# Altium schematic symbol library Schlib.SchLib: 725 symbols (part 4 of 6) (continued)
## LTC2954CDDB-1#TRMPBF (continued)

## LTC2954ITS8-1#TRPBF
designator U?  (value not drawn)
IC PB ON/OFF CONTROLLER TSOT23-8; Manufacturer: Analog Devices / Linear Technology; Manufacturer Part Number: LTC2954ITS8-1#TRPBF; Supplier: Mouser; Supplier Part Number: 584-C2954ITS8-1TRPBF; RoHS: Yes; Category: Voltage Supervisors; Stock: 2500; Pricing: 1=6.18, 10=5.58, 50=5.33, 100=4.63, 1000=3.51, 10000=3.38 (USD); ComponentLink1URL: https://datasheet.ciiva.com/1967/16598-1967661.pdf?src-supplier=Digikey; ComponentLink1Description: https://datasheet.ciiva.com/1967/16598-1967661.pdf?src-supplier=Digikey
footprint TSOT-23_TS8
pins: 1 Vin, 2 ~{PB}, 3 ONT, 4 GND, 5 ~{INT}, 6 EN, 7 PDT, 8 ~{KILL}

## LTC2955IDDB-1#TRMPBF
designator U?  (value not drawn)
Linear TECHNOLOGYLTC2955IDDB-1#TRMPBFIC, Push Button On/off Controller, DFN-10; Manufacturer: Analog Devices / Linear Technology; Min Supply Voltage: 1.6V; Max Supply Voltage: 36V; Operating Supply Current: 1.2uA; Threshold Voltage: 800mV; Supplier: Mouser; Supplier Part Number: 584-C2955IDDB-1TMPF; Manufacturer Part Number: LTC2955IDDB-1#TRMPBF; RoHS: Yes; Category: Voltage Supervisors; Stock: 1191; Pricing: 1=6.87, 10=6.21, 50=5.93, 100=5.15, 1000=4.47, 10000=4.47 (USD); Case/Package: DFN; Pins: 10; Min Operating Temperature: -40°C; Max Operating Temperature: 85°C; Package Quantity: 500; Packaging: Tape and Reel; Nominal Supply Current: 1.2uA; Reach SVHC Compliant: No; Lead Free: Lead Free; RoHS Compliant: Yes; ComponentLink1URL: https://datasheet.ciiva.com/1176/1563221-1176339.pdf?src-supplier=Newark; ComponentLink1Description: https://datasheet.ciiva.com/1176/1563221-1176339.pdf?src-supplier=Newark; ComponentLink2URL: https://datasheet.ciiva.com/1169/1563221-1169346.pdf?src-supplier=Element14; ComponentLink2Description: https://datasheet.ciiva.com/1169/1563221-1169346.pdf?src-supplier=Element14; ComponentLink3URL: https://datasheet.ciiva.com/22621/1563221-22621578.pdf?src-supplier=Element14; ComponentLink3Description: https://datasheet.ciiva.com/22621/1563221-22621578.pdf?src-supplier=Element14; ComponentLink4URL: https://datasheet.ciiva.com/1967/41161-1967533.pdf?src-supplier=Digikey; ComponentLink4Description: https://datasheet.ciiva.com/1967/41161-1967533.pdf?src-supplier=Digikey; ComponentLink5URL: https://datasheet.ciiva.com/1173/1563221-1173151.pdf?src-supplier=Farnell; ComponentLink5Description: https://datasheet.ciiva.com/1173/1563221-1173151.pdf?src-supplier=Farnell; ComponentLink6URL: https://datasheet.ciiva.com/1967/41161-1967535.pdf?src-supplier=Digikey; ComponentLink6Description: https://datasheet.ciiva.com/1967/41161-1967535.pdf?src-supplier=Digikey; ComponentLink7URL: https://datasheet.ciiva.com/48695/001256199-da-01-en-ic-ctlr-ltc2955iddb-1-trmpbf-dfn-10-ltc-48695846.pdf?src-supplier=Conrad; ComponentLink7Description: https://datasheet.ciiva.com/48695/001256199-da-01-en-ic-ctlr-ltc2955iddb-1-trmpbf-dfn-10-ltc-48695846.pdf?src-supplier=Conrad
pins: 1 ~{INT}, 2 ~{PGD}, 3 EN/~{EN}, 4 VIN, 5 ~{PB}, 6 GND, 7 SEL, 8 TMR, 9 ~{KILL}, 10 ON

## LTC2955ITS8-1#TRMPBF
designator U?  (value not drawn)
Controller 1.5V to 36V Tape and Reel 8-Pin TSOT-23; Manufacturer: Analog Devices / Linear Technology; Manufacturer Part Number: LTC2955ITS8-1#TRMPBF; Nominal Supply Current: 1.2uA; Supplier: Mouser; Supplier Part Number: 584-C2955ITS8-1TMPF; RoHS: Yes; Category: Voltage Supervisors; Stock: 10589; Pricing: 1=6.86, 10=6.2, 50=5.89, 100=5.05, 1000=3.87, 10000=3.87 (USD); Lead Free: 5697LeadFree; RoHS Compliant: 5897YesNo; ComponentLink1URL: https://datasheet.ciiva.com/28416/1563221-28416389.pdf?src-supplier=Element14; ComponentLink1Description: https://datasheet.ciiva.com/28416/1563221-28416389.pdf?src-supplier=Element14; ComponentLink2URL: https://datasheet.ciiva.com/6943/1563221-6943848.pdf?src-supplier=Newark; ComponentLink2Description: https://datasheet.ciiva.com/6943/1563221-6943848.pdf?src-supplier=Newark; ComponentLink3URL: https://datasheet.ciiva.com/1176/1563221-1176341.pdf?src-supplier=Newark; ComponentLink3Description: https://datasheet.ciiva.com/1176/1563221-1176341.pdf?src-supplier=Newark; ComponentLink4URL: https://datasheet.ciiva.com/1169/1563221-1169348.pdf?src-supplier=Element14; ComponentLink4Description: https://datasheet.ciiva.com/1169/1563221-1169348.pdf?src-supplier=Element14; ComponentLink5URL: https://datasheet.ciiva.com/31400/1563221-31400492.pdf?src-supplier=Farnell; ComponentLink5Description: https://datasheet.ciiva.com/31400/1563221-31400492.pdf?src-supplier=Farnell; ComponentLink6URL: https://datasheet.ciiva.com/1173/1563221-1173153.pdf?src-supplier=Farnell; ComponentLink6Description: https://datasheet.ciiva.com/1173/1563221-1173153.pdf?src-supplier=Farnell; ComponentLink7URL: https://datasheet.ciiva.com/1967/41161-1967539.pdf?src-supplier=Digikey; ComponentLink7Description: https://datasheet.ciiva.com/1967/41161-1967539.pdf?src-supplier=Digikey; ComponentLink8URL: https://datasheet.ciiva.com/1967/41161-1967540.pdf?src-supplier=Digikey; ComponentLink8Description: https://datasheet.ciiva.com/1967/41161-1967540.pdf?src-supplier=Digikey; ComponentLink9URL: https://datasheet.ciiva.com/1967/41161-1967541.pdf?src-supplier=Digikey; ComponentLink9Description: https://datasheet.ciiva.com/1967/41161-1967541.pdf?src-supplier=Digikey
footprint TSOT-23_TS8
pins: 1 ON, 2 ~{KILL}, 3 TMR, 4 GND, 5 ~{PB}, 6 Vin, 7 EN, 8 ~{INT}

## LTC2955ITS8-2#TRPBF
designator U?  (value not drawn)
IC PB ON/OFF CTRLR TSOT23-8 / Controller 1.5V to 36V Automotive 8-Pin TSOT-23 T/R; Manufacturer: Analog Devices / Linear Technology; Manufacturer Part Number: LTC2955ITS8-2#TRPBF; Operating Supply Current: 1.2uA; Supplier: Mouser; Supplier Part Number: 584-C2955ITS8-2TRPBF; RoHS: Yes; Category: Integrated Circuits (ICs); Stock: 2291; Pricing: 1=6.87, 10=6.21, 50=5.93, 100=5.15, 1000=3.9, 10000=3.75 (USD); Case/Package: SOT-23-8; Pins: 8; Min Operating Temperature: -40°C; Max Operating Temperature: 85°C; Package Quantity: 2500; Packaging: Tape and Reel; Length: 2.9mm; RoHS Compliant: Yes; ComponentLink1URL: https://datasheet.ciiva.com/1967/41161-1967676.pdf?src-supplier=Digikey; ComponentLink1Description: https://datasheet.ciiva.com/1967/41161-1967676.pdf?src-supplier=Digikey
footprint TSOT-23_TS8
pins: 1 ON, 2 ~{KILL}, 3 TMR, 4 GND, 5 ~{PB}, 6 Vin, 7 ~{EN}, 8 ~{INT}

## LTC6992IS6-2#TRMPBF
designator U?  (value not drawn)
Silicon Oscillator 0.00000381MHz to 1MHz CMOS 6-Pin TSOT-23 Tape and Reel; Manufacturer: Analog Devices / Linear Technology; Manufacturer Part Number: LTC6992IS6-2#TRMPBF; Frequency: 3.81Hz; Operating Supply Current: 365uA; Supplier: Farnell; Supplier Part Number: 4023659; RoHS: Yes; Category: Timers and Oscillators; Stock: 328; Pricing: 1=5.18, 10=3.96, 25=3.66, 100=3.18, 250=2.86, 500=2.68 (EUR); Mounting Technology: Surface Mount; Case/Package: SOT-23-6; Pins: 23; Min Operating Temperature: -40°C; Max Operating Temperature: 85°C; Package Quantity: 1; Packaging: Tape and Reel; Series: TimerBlox®; Length: 2.9mm; Depth: 1.75mm; Radiation Hardening: No; RoHS Compliant: Yes; ComponentLink1URL: https://datasheet.ciiva.com/15116/getdatasheetpartid-386929-15116191.pdf?src-supplier=Verical; ComponentLink1Description: https://datasheet.ciiva.com/15116/getdatasheetpartid-386929-15116191.pdf?src-supplier=Verical; ComponentLink2URL: https://datasheet.ciiva.com/6668/29337-6668302.pdf?src-supplier=Digikey; ComponentLink2Description: https://datasheet.ciiva.com/6668/29337-6668302.pdf?src-supplier=Digikey; ComponentLink3URL: https://datasheet.ciiva.com/48709/001253676-da-01-en-ic-osc-ltc6992is6-2-trmpbf-tsot-23-6-ltc-48709111.pdf?src-supplier=Conrad; ComponentLink3Description: https://datasheet.ciiva.com/48709/001253676-da-01-en-ic-osc-ltc6992is6-2-trmpbf-tsot-23-6-ltc-48709111.pdf?src-supplier=Conrad
footprint TSOT-23-6
pins: 1 MOD, 2 GND, 3 SET, 4 DIV, 5 V+, 6 OUT

## LTST-C190KRKT
designator D?  (value not drawn)
Single-color LEDs; LITEON; LTST-C190KRKT; Red; 130 °; 2.4 V; 0603; Manufacturer: Lite-On; Dominant Wavelength: 631nm; Forward Current: 25mA; Forward Voltage: 2.4V; Lens Color: Clear, Colorless; Lens Style: Clear; Luminous Intensity: 18mcd; Number of Circuits: 1; Peak Wavelength: 639nm; Power Dissipation: 62.5mW; Power Rating: 75mW; Reverse Voltage: 5V; Shape: Rectangular; Test Current: 20mA; Tolerance: 20%; Viewing Angle: 260°; Voltage Rating: 50V; Supplier: RS; Supplier Part Number: 1769795; Manufacturer Part Number: LTST-C190KRKT; RoHS: Compliant; Category: LEDs; Stock: 48000; Pricing: 4000=0.029 (GBP); Case/Package: 0603; Case Code (Imperial): 0603; Case Code (Metric): 1608; China RoHS: Compliant; Color: Red; Depth: 800µm; Diameter: 8mm; Height: 800µm; Illumination Color: Red; Lead Free: Lead Free; Lead Pitch: 3.5mm; Length: 11.5mm; Lens Transparency: Clear; Lifecycle Status: Production; Max Operating Temperature: 85°C; Min Operating Temperature: -30°C; Mounting Technology: Surface Mount; Number of Elements: 1; Number of LEDs: 1; Pins: 2; Number of Terminals: 2; Packaging: Bulk; Radiation Hardening: No; REACH SVHC: Yes; Schedule B: 8541402000, 8541402000|8541402000, 8541402000|8541402000|8541402000, 8541402000|8541402000|8541402000|8541402000; Voltage Rating (DC): 50V; Wavelength: 631nm; Width: 800µm; ComponentLink1URL: https://datasheet.octopart.com:443/LTST-C190KRKT-Lite-On-datasheet-32047000.pdf?src-supplier=Upverter; ComponentLink1Description: https://datasheet.octopart.com:443/LTST-C190KRKT-Lite-On-datasheet-32047000.pdf?src-supplier=Upverter; ComponentLink2URL: https://datasheet.octopart.com:443/LTST-C190KRKT-Lite-On-datasheet-114749306.pdf?src-supplier=ODG+(Origin+Data+Global); ComponentLink2Description: https://datasheet.octopart.com:443/LTST-C190KRKT-Lite-On-datasheet-114749306.pdf?src-supplier=ODG+(Origin+Data+Global); ComponentLink3URL: https://datasheet.octopart.com:443/LTST-C190KRKT-Lite-On-datasheet-166650849.pdf?src-supplier=IHS; ComponentLink3Description: https://datasheet.octopart.com:443/LTST-C190KRKT-Lite-On-datasheet-166650849.pdf?src-supplier=IHS; ComponentLink4URL: https://datasheet.octopart.com:443/LTST-C190KRKT-Lite-On-datasheet-158191.pdf?src-supplier=_legacy+Avnet; ComponentLink4Description: https://datasheet.octopart.com:443/LTST-C190KRKT-Lite-On-datasheet-158191.pdf?src-supplier=_legacy+Avnet; ComponentLink5URL: https://datasheet.octopart.com:443/LTST-C190KRKT-Lite-On-datasheet-165573809.pdf?src-supplier=TME; ComponentLink5Description: https://datasheet.octopart.com:443/LTST-C190KRKT-Lite-On-datasheet-165573809.pdf?src-supplier=TME; ComponentLink6URL: https://datasheet.octopart.com:443/LTST-C190KRKT-Lite-On-datasheet-165573808.pdf?src-supplier=TME; ComponentLink6Description: https://datasheet.octopart.com:443/LTST-C190KRKT-Lite-On-datasheet-165573808.pdf?src-supplier=TME; ComponentLink7URL: https://datasheet.octopart.com:443/LTST-C190KRKT-Lite-On-datasheet-12557188.pdf?src-supplier=Future+Electronics; ComponentLink7Description: https://datasheet.octopart.com:443/LTST-C190KRKT-Lite-On-datasheet-12557188.pdf?src-supplier=Future+Electronics; ComponentLink8URL: https://datasheet.octopart.com:443/LTST-C190KRKT-Lite-On-datasheet-8329900.pdf?src-supplier=Future+Electronics; ComponentLink8Description: https://datasheet.octopart.com:443/LTST-C190KRKT-Lite-On-datasheet-8329900.pdf?src-supplier=Future+Electronics; ComponentLink9URL: https://datasheet.octopart.com:443/LTST-C190KRKT-Lite-On-datasheet-8319956.pdf?src-supplier=Jameco; ComponentLink9Description: https://datasheet.octopart.com:443/LTST-C190KRKT-Lite-On-datasheet-8319956.pdf?src-supplier=Jameco; ComponentLink10URL: https://datasheet.octopart.com:443/LTST-C190KRKT-Lite-On-datasheet-94958.pdf?src-supplier=DigiKey; ComponentLink10Description: https://datasheet.octopart.com:443/LTST-C190KRKT-Lite-On-datasheet-94958.pdf?src-supplier=DigiKey
footprint LTST-C190KRKT
pins: 1 C, 2 A

## LTST-C190KSKT
designator D?  (value not drawn)
Single-color LEDs; LITEON; LTST-C190KSKT; Yellow; 130 °; 2.4 V; 0603; Manufacturer: Lite-On; Dominant Wavelength: 597nm; Forward Current: 30mA; Forward Voltage: 2.4V; Lens Color: Clear, Colorless; Lens Style: Clear; Luminous Intensity: 28mcd; Number of Circuits: 1; Peak Wavelength: 588nm; Power Dissipation: 75mW; Power Rating: 100mW; Value: 12kΩ; Reverse Voltage: 5V; Shape: Rectangular; Test Current: 20mA; Tolerance: 1%; Viewing Angle: 130°; Voltage Rating: 50V; Supplier: RS; Supplier Part Number: 6920985; Manufacturer Part Number: LTST-C190KSKT; RoHS: Compliant; Category: LEDs; Stock: 3200; Pricing: 50=0.043, 250=0.027, 500=0.027, 1250=0.026, 2500=0.025 (GBP); Case/Package: 0603; Case Code (Imperial): 0603; Case Code (Metric): 1608; China RoHS: Compliant; Color: Yellow; Contact Plating: Gold; Depth: 1.6mm; Height: 800µm; Illumination Color: Yellow; Lead Free: Lead Free; Length: 1.6mm; Lens Transparency: Clear; Lifecycle Status: Production; Max Operating Temperature: 85°C; Min Operating Temperature: -30°C; Mounting Technology: Surface Mount; Number of Elements: 1; Number of LEDs: 1; Pins: 2; Number of Terminals: 2; Packaging: Tape and Reel; Radiation Hardening: No; REACH SVHC: Yes; Schedule B: 8541402000, 8541402000|8541402000, 8541402000|8541402000|8541402000, 8541402000|8541402000|8541402000|8541402000; Terminal Pitch: 1.5mm; Voltage Rating (DC): 50V; Wavelength: 597nm; Width: 800µm; ComponentLink1URL: https://datasheet.octopart.com:443/LTST-C190KSKT-Lite-On-datasheet-32047001.pdf?src-supplier=Upverter; ComponentLink1Description: https://datasheet.octopart.com:443/LTST-C190KSKT-Lite-On-datasheet-32047001.pdf?src-supplier=Upverter; ComponentLink2URL: https://datasheet.octopart.com:443/LTST-C190KSKT-Lite-On-datasheet-141446390.pdf?src-supplier=ODG+(Origin+Data+Global); ComponentLink2Description: https://datasheet.octopart.com:443/LTST-C190KSKT-Lite-On-datasheet-141446390.pdf?src-supplier=ODG+(Origin+Data+Global); ComponentLink3URL: https://datasheet.octopart.com:443/LTST-C190KSKT-Lite-On-datasheet-180605180.pdf?src-supplier=IHS; ComponentLink3Description: https://datasheet.octopart.com:443/LTST-C190KSKT-Lite-On-datasheet-180605180.pdf?src-supplier=IHS; ComponentLink4URL: https://datasheet.octopart.com:443/LTST-C190KSKT-Lite-On-datasheet-159376.pdf?src-supplier=Future+Electronics; ComponentLink4Description: https://datasheet.octopart.com:443/LTST-C190KSKT-Lite-On-datasheet-159376.pdf?src-supplier=Future+Electronics; ComponentLink5URL: https://datasheet.octopart.com:443/LTST-C190KSKT-Lite-On-datasheet-165573809.pdf?src-supplier=TME; ComponentLink5Description: https://datasheet.octopart.com:443/LTST-C190KSKT-Lite-On-datasheet-165573809.pdf?src-supplier=TME; ComponentLink6URL: https://datasheet.octopart.com:443/LTST-C190KSKT-Lite-On-datasheet-165573808.pdf?src-supplier=TME; ComponentLink6Description: https://datasheet.octopart.com:443/LTST-C190KSKT-Lite-On-datasheet-165573808.pdf?src-supplier=TME; ComponentLink7URL: https://datasheet.octopart.com:443/LTST-C190KSKT-Lite-On-datasheet-13699376.pdf?src-supplier=_legacy+Avnet; ComponentLink7Description: https://datasheet.octopart.com:443/LTST-C190KSKT-Lite-On-datasheet-13699376.pdf?src-supplier=_legacy+Avnet; ComponentLink8URL: https://datasheet.octopart.com:443/LTST-C190KSKT-Lite-On-datasheet-11642499.pdf?src-supplier=Arrow+Electronics; ComponentLink8Description: https://datasheet.octopart.com:443/LTST-C190KSKT-Lite-On-datasheet-11642499.pdf?src-supplier=Arrow+Electronics; ComponentLink9URL: https://datasheet.octopart.com:443/LTST-C190KSKT-Lite-On-datasheet-73796.pdf?src-supplier=DigiKey; ComponentLink9Description: https://datasheet.octopart.com:443/LTST-C190KSKT-Lite-On-datasheet-73796.pdf?src-supplier=DigiKey
footprint LTST-C190KSKT
pins: 1 K2, 2 A2

## LTST-C191KFKT
designator D?  (value not drawn)
Orange 0603 130° Water Clear 90 mcd 2 V SMT Rectangular Flat Top LED; Manufacturer: Lite-On; Manufacturer Part Number: LTST-C191KFKT; Dominant Wavelength: 605nm; Forward Current: 30mA; Forward Voltage: 2.4V; Lens Color: Colorless; Luminous Intensity: 90mcd; Number of Circuits: 1; Peak Wavelength: 611nm; Power Dissipation: 75mW; Reverse Voltage: 5V; Test Current: 20mA; Supplier: Avnet; Supplier Part Number: LTST-C191KFKT; RoHS: Compliant; Category: LEDs; Stock: 10000; Pricing: 5000=0.025, 10000=0.02444, 20000=0.02388, 40000=0.02331, 80000=0.02275 (USD); Case/Package: 0603; Case Code (Imperial): 0603; Case Code (Metric): 1608; China RoHS: Compliant; Color: Orange; Depth: 800µm; Height: 550µm; Illumination Color: Orange; Lead Free: Lead Free; Length: 1.6mm; Lens Transparency: Clear; Lifecycle Status: Production; Max Operating Temperature: 85°C; Min Operating Temperature: -55°C; Mounting Technology: Surface Mount; Number of Elements: 1; Number of LEDs: 1; Pins: 2; Number of Terminals: 2; Packaging: Cut Tape; Power Rating: 75mW; Radiation Hardening: No; REACH SVHC: Yes; Schedule B: 8541402000, 8541402000|8541402000|8541402000|8541402000|8541402000; Shape: Rectangular; Terminal Pitch: 1.5mm; Viewing Angle: 130°; Wavelength: 605nm; Width: 800µm; ComponentLink1URL: https://datasheet.octopart.com:443/LTST-C191KFKT-Lite-On-datasheet-141422090.pdf?src-supplier=ODG+(Origin+Data+Global); ComponentLink1Description: https://datasheet.octopart.com:443/LTST-C191KFKT-Lite-On-datasheet-141422090.pdf?src-supplier=ODG+(Origin+Data+Global); ComponentLink2URL: https://datasheet.octopart.com:443/LTST-C191KFKT-Lite-On-datasheet-180605189.pdf?src-supplier=IHS; ComponentLink2Description: https://datasheet.octopart.com:443/LTST-C191KFKT-Lite-On-datasheet-180605189.pdf?src-supplier=IHS; ComponentLink3URL: https://datasheet.octopart.com:443/LTST-C191KFKT-Lite-On-datasheet-41172769.pdf?src-supplier=TME; ComponentLink3Description: https://datasheet.octopart.com:443/LTST-C191KFKT-Lite-On-datasheet-41172769.pdf?src-supplier=TME; ComponentLink4URL: https://datasheet.octopart.com:443/LTST-C191KFKT-Lite-On-datasheet-165573808.pdf?src-supplier=TME; ComponentLink4Description: https://datasheet.octopart.com:443/LTST-C191KFKT-Lite-On-datasheet-165573808.pdf?src-supplier=TME; ComponentLink5URL: https://datasheet.octopart.com:443/LTST-C191KFKT-Lite-On-datasheet-13695973.pdf?src-supplier=_legacy+Avnet; ComponentLink5Description: https://datasheet.octopart.com:443/LTST-C191KFKT-Lite-On-datasheet-13695973.pdf?src-supplier=_legacy+Avnet; ComponentLink6URL: https://datasheet.octopart.com:443/LTST-C191KFKT-Lite-On-datasheet-158560.pdf?src-supplier=Mouser; ComponentLink6Description: https://datasheet.octopart.com:443/LTST-C191KFKT-Lite-On-datasheet-158560.pdf?src-supplier=Mouser; ComponentLink7URL: https://datasheet.octopart.com:443/LTST-C191KFKT-Lite-On-datasheet-134312.pdf?src-supplier=DigiKey; ComponentLink7Description: https://datasheet.octopart.com:443/LTST-C191KFKT-Lite-On-datasheet-134312.pdf?src-supplier=DigiKey
footprint LTST-C191KFKT
pins: 1 C, 2 A

## LTST-C191KGKT
designator D?  (value not drawn)
LED,  LTST-C191KGKT; Manufacturer: Vishay Lite-On; Color: Green; Lens Color: Colorless; Luminous Intensity: 35mcd; Viewing Angle: 130°; Lens Style: Rectangular,Colorless; Forward Current: 30mA; Forward Voltage: 2V; Dominant Wavelength: 571nm; Test Current: 20mA; Lens Transparency: Clear; Number of Elements: 1; Power Dissipation: 75mW; Wavelength: 574nm; Reverse Voltage: 5V; Supplier: Digi-Key; Supplier Part Number: 160-1446-1-ND; Manufacturer Part Number: LTST-C191KGKT; RoHS: Yes; Category: Uncategorized; Stock: 2799441; Pricing: 1=0.26000, 10=0.14100, 100=0.06560, 500=0.06060, 1000=0.04747, 2000=0.04646 (USD); Mounting Technology: Surface Mount; Case/Package: 0603; Pins: 2; Case Code (Metric): 1608; Case Code (Imperial): 0603; Min Operating Temperature: -55°C; Max Operating Temperature: 85°C; Packaging: Tape and Reel; Package Quantity: 1; Illumination Color: Green; Number of LEDs: 1; Power Rating: 75mW; Max Power Dissipation: 75mW; Length: 1.6mm; Width: 0.8mm; Height: 0.55mm; Depth: 0.8mm; Radiation Hardening: No; RoHS Compliant: Yes; Lead Free: Lead Free; ComponentLink1URL: https://datasheet.ciiva.com/2109/ltst-c191kgkt-2109973.pdf?src-supplier=Digi-Key; ComponentLink1Description: https://datasheet.ciiva.com/2109/ltst-c191kgkt-2109973.pdf?src-supplier=Digi-Key
footprint LTST-C191KGKT
pins: 1 K2, 2 A2

## LTST-C191KSKT
designator D?  (value not drawn)
LED YELLOW CLEAR 0603 SMD; Manufacturer: Vishay Lite-On; Manufacturer Part Number: LTST-C191KSKT; Lens Color: Colorless; Viewing Angle: 130°; Lens Style: Diffused,Colorless,Rectangular,Clear; Luminous Intensity: 180mcd; Forward Current: 30mA; Forward Voltage: 2.4V; Power Rating: 75mW; Dominant Wavelength: 597nm; Test Current: 20mA; Number of Elements: 1; Wavelength: 588nm; Reverse Voltage: 5V; Supplier: Digi-Key; Supplier Part Number: 160-1448-1-ND; RoHS: Yes; Category: LEDs; Stock: 1462399; Pricing: 1=0.28000, 10=0.15000, 100=0.06990, 500=0.06450, 1000=0.05052, 2000=0.04945 (USD); Mounting Technology: Surface Mount; Case/Package: 0603; Pins: 2; Color: Yellow; Case Code (Metric): 1608; Case Code (Imperial): 0603; Min Operating Temperature: -55°C; Max Operating Temperature: 85°C; Package Quantity: 1; Packaging: Tape and Reel; Illumination Color: Yellow; Lens Transparency: Clear; Power Dissipation: 75mW; Number of LEDs: 1; Length: 1.6mm; Width: 0.8mm; Height: 0.55mm; Depth: 0.8mm; Radiation Hardening: No; RoHS Compliant: Yes; Lead Free: Lead Free; ComponentLink1URL: https://datasheet.ciiva.com/12400/lite-on-ltst-c191kskt-190097-12400797.pdf?src-supplier=Mouser; ComponentLink1Description: https://datasheet.ciiva.com/12400/lite-on-ltst-c191kskt-190097-12400797.pdf?src-supplier=Mouser; ComponentLink2URL: https://datasheet.ciiva.com/16213/lite-on20ltst-c191kskt-16213725.pdf?src-supplier=Future+Electronics; ComponentLink2Description: https://datasheet.ciiva.com/16213/lite-on20ltst-c191kskt-16213725.pdf?src-supplier=Future+Electronics; ComponentLink3URL: https://datasheet.ciiva.com/15117/getdatasheetpartid-141495-15117732.pdf?src-supplier=Verical; ComponentLink3Description: https://datasheet.ciiva.com/15117/getdatasheetpartid-141495-15117732.pdf?src-supplier=Verical; ComponentLink4URL: https://datasheet.ciiva.com/11773/0900766b80dc02b3-11773512.pdf?src-supplier=Rs; ComponentLink4Description: https://datasheet.ciiva.com/11773/0900766b80dc02b3-11773512.pdf?src-supplier=Rs; ComponentLink5URL: https://datasheet.ciiva.com/2109/s-110-ltst-c191kskt-2109984.pdf?src-supplier=Digi-Key; ComponentLink5Description: https://datasheet.ciiva.com/2109/s-110-ltst-c191kskt-2109984.pdf?src-supplier=Digi-Key
footprint LTST-C191KSKT
pins: 1 K2, 2 A2

## LTST-S270KFKT
designator D?  (value not drawn)
LED Low-Power Uni-Color Orange 611nm 2V 2-Pin Chip LED T/R; Manufacturer: Vishay Lite-On; Manufacturer Part Number: LTST-S270KFKT; Lens Color: Colorless; Lens Style: Diffused,Colorless,Rectangular,Clear; Viewing Angle: 130°; Luminous Intensity: 90mcd; Forward Current: 20mA; Dominant Wavelength: 605nm; Number of Elements: 1; Power Dissipation: 75mW; Reverse Voltage: 5V; Lens Transparency: Clear; Supplier: Rs; Supplier Part Number: 6921215P; RoHS: Yes; Category: LEDs; Stock: 6300; Pricing: 250=0.04800, 500=0.04500, 1250=0.03600, 2500=0.03400 (GBP); Mounting Technology: Surface Mount; Case/Package: 0603; Pins: 2; Color: Orange; Case Code (Metric): 1608; Case Code (Imperial): 0603; Min Operating Temperature: -55°C; Max Operating Temperature: 85°C; Forward Voltage: 2V; Packaging: Tape and Reel; Test Current: 20mA; Package Quantity: 1; Illumination Color: Orange; Power Rating: 75mW; Wavelength: 611nm; Number of LEDs: 1; Length: 1.6mm; Width: 1.15mm; Height: 0.6mm; Depth: 0.6mm; Radiation Hardening: No; Lead Free: Lead Free; RoHS Compliant: Yes; ComponentLink1URL: https://datasheet.ciiva.com/12400/ltst-s270kfkt-201846-12400779.pdf?src-supplier=Mouser; ComponentLink1Description: https://datasheet.ciiva.com/12400/ltst-s270kfkt-201846-12400779.pdf?src-supplier=Mouser; ComponentLink2URL: https://datasheet.ciiva.com/11775/0900766b80dc0b87-11775446.pdf?src-supplier=Rs; ComponentLink2Description: https://datasheet.ciiva.com/11775/0900766b80dc0b87-11775446.pdf?src-supplier=Rs; ComponentLink3URL: https://datasheet.ciiva.com/2109/s-110-ltst-s270kfkt-2109995.pdf?src-supplier=Digi-Key; ComponentLink3Description: https://datasheet.ciiva.com/2109/s-110-ltst-s270kfkt-2109995.pdf?src-supplier=Digi-Key; ComponentLink4URL: https://datasheet.ciiva.com/2109/s-110-ltst-s270kfkt-2109996.pdf?src-supplier=Digi-Key; ComponentLink4Description: https://datasheet.ciiva.com/2109/s-110-ltst-s270kfkt-2109996.pdf?src-supplier=Digi-Key
footprint LTST-S270KFKT
pins: 1 C, 2 A

## LTST-S270KGKT
designator D?  (value not drawn)
LED GREEN CLEAR 0603 R/A SMD; Manufacturer: Vishay Lite-On; Manufacturer Part Number: LTST-S270KGKT; Lens Color: Colorless; Forward Current: 30mA; Forward Voltage: 2V; Power Rating: 75mW; Luminous Intensity: 71mcd; Viewing Angle: 130°; Lens Style: Diffused,Colorless,Rectangular,Clear; Dominant Wavelength: 571nm; Test Current: 20mA; Number of Elements: 1; Wavelength: 574nm; Reverse Voltage: 5V; Supplier: Rs; Supplier Part Number: 6921219P; RoHS: Yes; Category: LEDs; Stock: 35150; Pricing: 250=0.06300, 500=0.05900, 1250=0.03700, 2500=0.03500 (GBP); Mounting Technology: Surface Mount; Case/Package: 0603; Pins: 2; Color: Green; Case Code (Metric): 1608; Case Code (Imperial): 0603; Min Operating Temperature: -55°C; Max Operating Temperature: 85°C; Illumination Color: Green; Packaging: Tape and Reel; Package Quantity: 1; Lens Transparency: Clear; Power Dissipation: 75mW; Number of LEDs: 1; Length: 1.6mm; Width: 1.15mm; Height: 0.6mm; Depth: 0.6mm; Radiation Hardening: No; Lead Free: Lead Free; RoHS Compliant: Yes; ComponentLink1URL: https://datasheet.ciiva.com/2110/ltst-s270kgkt-2110006.pdf?src-supplier=Digi-Key; ComponentLink1Description: https://datasheet.ciiva.com/2110/ltst-s270kgkt-2110006.pdf?src-supplier=Digi-Key; ComponentLink2URL: https://datasheet.ciiva.com/12400/ltst-s270kgkt-201847-12400865.pdf?src-supplier=Mouser; ComponentLink2Description: https://datasheet.ciiva.com/12400/ltst-s270kgkt-201847-12400865.pdf?src-supplier=Mouser; ComponentLink3URL: https://datasheet.ciiva.com/4266/dwonloadfilehandler-ashxtxtspecnods222000226-4266440.pdf?src-supplier=Arrow+Electronics; ComponentLink3Description: https://datasheet.ciiva.com/4266/dwonloadfilehandler-ashxtxtspecnods222000226-4266440.pdf?src-supplier=Arrow+Electronics; ComponentLink4URL: https://datasheet.ciiva.com/11774/0900766b80dc0b88-11774745.pdf?src-supplier=Rs; ComponentLink4Description: https://datasheet.ciiva.com/11774/0900766b80dc0b88-11774745.pdf?src-supplier=Rs; ComponentLink5URL: https://datasheet.ciiva.com/2110/s-110-ltst-s270kgkt-2110007.pdf?src-supplier=Digi-Key; ComponentLink5Description: https://datasheet.ciiva.com/2110/s-110-ltst-s270kgkt-2110007.pdf?src-supplier=Digi-Key; ComponentLink6URL: https://datasheet.ciiva.com/2110/s-110-ltst-s270kgkt-2110008.pdf?src-supplier=Digi-Key; ComponentLink6Description: https://datasheet.ciiva.com/2110/s-110-ltst-s270kgkt-2110008.pdf?src-supplier=Digi-Key; ComponentLink7URL: https://datasheet.ciiva.com/16448/ltst-s270kgkt-16448566.pdf?src-supplier=Future+Electronics; ComponentLink7Description: https://datasheet.ciiva.com/16448/ltst-s270kgkt-16448566.pdf?src-supplier=Future+Electronics
footprint LTST-S270KGKT
pins: 1 C, 2 A

## LTST-S270KRKT
designator D?  (value not drawn)
LED Low-Power Uni-Color Red 639nm 2V 2-Pin Chip LED T/R; Manufacturer: Vishay Lite-On; Manufacturer Part Number: LTST-S270KRKT; Lens Color: Colorless; Forward Current: 30mA; Luminous Intensity: 54mcd; Viewing Angle: 130°; Lens Style: Diffused,Colorless,Clear,Rectangular; Power Rating: 75mW; Dominant Wavelength: 631nm; Test Current: 20mA; Lens Transparency: Clear; Number of Elements: 1; Reverse Voltage: 5V; Supplier: Rs; Supplier Part Number: 6921228P; RoHS: Yes; Category: LEDs; Stock: 29845; Pricing: 250=0.06300, 500=0.05900, 1250=0.03700, 2500=0.03500 (GBP); Mounting Technology: Surface Mount; Case/Package: 0603; Pins: 2; Color: Red; Case Code (Metric): 1608; Case Code (Imperial): 0603; Min Operating Temperature: -55°C; Max Operating Temperature: 85°C; Packaging: Tape and Reel; Forward Voltage: 2V; Package Quantity: 1; Illumination Color: Red; Power Dissipation: 75mW; Wavelength: 639nm; Number of LEDs: 1; Max Power Dissipation: 75mW; Length: 1.6mm; Width: 1.15mm; Height: 0.6mm; Depth: 0.6mm; Radiation Hardening: No; Lead Free: Lead Free; RoHS Compliant: Yes; ComponentLink1URL: https://datasheet.ciiva.com/2110/ltst-s270krkt-2110021.pdf?src-supplier=Digi-Key; ComponentLink1Description: https://datasheet.ciiva.com/2110/ltst-s270krkt-2110021.pdf?src-supplier=Digi-Key; ComponentLink2URL: https://datasheet.ciiva.com/12400/ltst-s270krkt-201849-12400833.pdf?src-supplier=Mouser; ComponentLink2Description: https://datasheet.ciiva.com/12400/ltst-s270krkt-201849-12400833.pdf?src-supplier=Mouser; ComponentLink3URL: https://datasheet.ciiva.com/16387/p-100-ltst-s270krkt-16387507.pdf?src-supplier=Future+Electronics; ComponentLink3Description: https://datasheet.ciiva.com/16387/p-100-ltst-s270krkt-16387507.pdf?src-supplier=Future+Electronics; ComponentLink4URL: https://datasheet.ciiva.com/11775/0900766b80dc0b8e-11775445.pdf?src-supplier=Rs; ComponentLink4Description: https://datasheet.ciiva.com/11775/0900766b80dc0b8e-11775445.pdf?src-supplier=Rs; ComponentLink5URL: https://datasheet.ciiva.com/2110/s-110-ltst-s270krkt-2110022.pdf?src-supplier=Digi-Key; ComponentLink5Description: https://datasheet.ciiva.com/2110/s-110-ltst-s270krkt-2110022.pdf?src-supplier=Digi-Key; ComponentLink6URL: https://datasheet.ciiva.com/2110/s-110-ltst-s270krkt-2110023.pdf?src-supplier=Digi-Key; ComponentLink6Description: https://datasheet.ciiva.com/2110/s-110-ltst-s270krkt-2110023.pdf?src-supplier=Digi-Key
footprint LTST-S270KRKT
pins: 1 C, 2 A

## LTST-S270KSKT
designator D?  (value not drawn)
OPTOELECTRONICS - SMD Chip LED - SideView Single Color Chip LED, Yellow, 589 at 20mA, 28 to approx. 180 at 20mA; Manufacturer: Vishay Lite-On; Manufacturer Part Number: LTST-S270KSKT; Lens Color: Colorless; Power Rating: 75mW; Luminous Intensity: 80mcd; Viewing Angle: 130°; Lens Style: Diffused,Colorless,Rectangular,Clear; Forward Voltage: 2V; Forward Current: 30mA; Dominant Wavelength: 587nm; Lens Transparency: Clear; Number of Elements: 1; Reverse Voltage: 5V; Supplier: Rs; Supplier Part Number: 6921221P; RoHS: Yes; Category: LEDs; Stock: 4950; Pricing: 100=0.113 (EUR); Mounting Technology: Surface Mount; Case/Package: 0603; Pins: 2; Color: Yellow; Case Code (Metric): 1608; Case Code (Imperial): 0603; Min Operating Temperature: -55°C; Max Operating Temperature: 85°C; Packaging: Tape and Reel; Package Quantity: 1; Illumination Color: Yellow; Test Current: 20mA; Power Dissipation: 75mW; Wavelength: 587nm; Number of LEDs: 1; Length: 1.6mm; Width: 1.15mm; Height: 0.6mm; Depth: 0.6mm; Radiation Hardening: No; Lead Free: Lead Free; RoHS Compliant: Yes; ComponentLink1URL: https://datasheet.ciiva.com/11773/0900766b80dc0b8f-11773831.pdf?src-supplier=Rs; ComponentLink1Description: https://datasheet.ciiva.com/11773/0900766b80dc0b8f-11773831.pdf?src-supplier=Rs; ComponentLink2URL: https://datasheet.ciiva.com/12400/ltst-s270kskt-201858-12400983.pdf?src-supplier=Mouser; ComponentLink2Description: https://datasheet.ciiva.com/12400/ltst-s270kskt-201858-12400983.pdf?src-supplier=Mouser; ComponentLink3URL: https://datasheet.ciiva.com/16390/ltst-s270kskt-16390329.pdf?src-supplier=Future+Electronics; ComponentLink3Description: https://datasheet.ciiva.com/16390/ltst-s270kskt-16390329.pdf?src-supplier=Future+Electronics; ComponentLink4URL: https://datasheet.ciiva.com/2110/s-110-ltst-s270kskt-2110139.pdf?src-supplier=Digikey; ComponentLink4Description: https://datasheet.ciiva.com/2110/s-110-ltst-s270kskt-2110139.pdf?src-supplier=Digikey; ComponentLink5URL: https://datasheet.ciiva.com/2110/s-110-ltst-s270kskt-2110140.pdf?src-supplier=Digikey; ComponentLink5Description: https://datasheet.ciiva.com/2110/s-110-ltst-s270kskt-2110140.pdf?src-supplier=Digikey
footprint LTST-S270KSKT
pins: 1 K2, 2 A2

## LUCID_12S 90A ESC
designator ESC?  (value not drawn)
LUCID_12S 90A ESC; Manufacturer Part Number: LUCID_12S 90A ESC
footprint LUCID_12S 90A ESC
pins: 1 GND, 2 BAT+, 3 U, 4 V, 5 W, 6 S_GND, 7 Tx, 8 Rx, 9 PWM

## LVK12R020DER
designator R?  value 20mR  (hidden comment: *)
Res Metal Alloy 1206 0.02 Ohm 0.5% 0.5W(1/2W) ±50ppm/C Pad SMD T/R; Manufacturer: Ohmite; Manufacturer Part Number: LVK12R020DER; Supplier: Mouser; Supplier Part Number: 588-LVK12R020DER; RoHS: Yes; Category: Chip SMD Resistors; Stock: 22006; Pricing: 1=0.73, 10=0.625, 50=0.518, 100=0.428, 1000=0.264, 10000=0.264 (USD); Reach SVHC Compliant: 4187SVHC; ComponentLink1URL: https://datasheet.ciiva.com/5469/lvk-5469511.pdf?src-supplier=Mouser; ComponentLink1Description: https://datasheet.ciiva.com/5469/lvk-5469511.pdf?src-supplier=Mouser; ComponentLink2URL: https://datasheet.ciiva.com/46385/1786747-46385559.pdf?src-supplier=Element14; ComponentLink2Description: https://datasheet.ciiva.com/46385/1786747-46385559.pdf?src-supplier=Element14; ComponentLink3URL: https://datasheet.ciiva.com/2482/res-lvk-2482377.pdf?src-supplier=Digikey; ComponentLink3Description: https://datasheet.ciiva.com/2482/res-lvk-2482377.pdf?src-supplier=Digikey; ComponentLink4URL: https://datasheet.ciiva.com/2482/res-lvk-2482378.pdf?src-supplier=Digikey; ComponentLink4Description: https://datasheet.ciiva.com/2482/res-lvk-2482378.pdf?src-supplier=Digikey; ComponentLink5URL: https://datasheet.ciiva.com/2482/res-lvk-2482379.pdf?src-supplier=Digikey; ComponentLink5Description: https://datasheet.ciiva.com/2482/res-lvk-2482379.pdf?src-supplier=Digikey; ComponentLink6URL: https://datasheet.ciiva.com/7937/575641-7937853.pdf?src-supplier=Element14; ComponentLink6Description: https://datasheet.ciiva.com/7937/575641-7937853.pdf?src-supplier=Element14; ComponentLink7URL: https://datasheet.ciiva.com/7937/575641-7937854.pdf?src-supplier=Element14; ComponentLink7Description: https://datasheet.ciiva.com/7937/575641-7937854.pdf?src-supplier=Element14; ComponentLink8URL: https://datasheet.ciiva.com/15865/40lvk-15865311.pdf?src-supplier=Onlinecomponents.com; ComponentLink8Description: https://datasheet.ciiva.com/15865/40lvk-15865311.pdf?src-supplier=Onlinecomponents.com; Case/Package: 1206
footprint LVK12R020DER
pins: 1 B, 2 B, 3 B, 4 A

## LXES1UTAA1-157
designator D?  (value not drawn)
ESD Suppressor Diode TVS Bi-Dir 6V 2-Pin DFN T/R; Manufacturer: Murata; Manufacturer Part Number: LXES1UTAA1-157; Supplier: Digi-Key; Supplier Part Number: 490-12804-1-ND; RoHS: Yes; Category: TVS Diodes; Stock: 106472; Pricing: 1=0.42, 10=0.312, 100=0.1768, 500=0.11712, 1000=0.08979, 2000=0.07808, 5000=0.07027 (USD); ComponentLink1URL: http://www.mouser.com/ds/2/281/TPESD-E-1102056.pdf?src-supplier=Mouser; ComponentLink1Description: http://www.mouser.com/ds/2/281/TPESD-E-1102056.pdf?src-supplier=Mouser; ComponentLink2URL: https://www.murata.com/en-us/products/productdata/8796859793438/TPESD-E.pdf?src-supplier=Digi-Key; ComponentLink2Description: https://www.murata.com/en-us/products/productdata/8796859793438/TPESD-E.pdf?src-supplier=Digi-Key; ComponentLink3URL: https://www.murata.com/en-us/products/productdata/8796782067742/L0160E.pdf?src-supplier=Digi-Key; ComponentLink3Description: https://www.murata.com/en-us/products/productdata/8796782067742/L0160E.pdf?src-supplier=Digi-Key; ComponentLink4URL: http://www.murata.com/en-us/products/productdata/8796859793438/TPESD-E.pdf?src-supplier=Digi-Key; ComponentLink4Description: http://www.murata.com/en-us/products/productdata/8796859793438/TPESD-E.pdf?src-supplier=Digi-Key
footprint LXES1UTAA1-157
pins: 1 C, 2 A

## M80-5401222
designator J?  value M80-5401222
HARWIN 6+6 Datamate J-Tek MALE 3mm connector; Part Number: M80-5401222
footprint HARWIN_M80-5401222 (HARWIN 6+6 Datamate J-Tek MALE 3mm connector)
pins: 1, 2, 3, 4, 5, 6, 7, 8, 9, 10, 11, 12

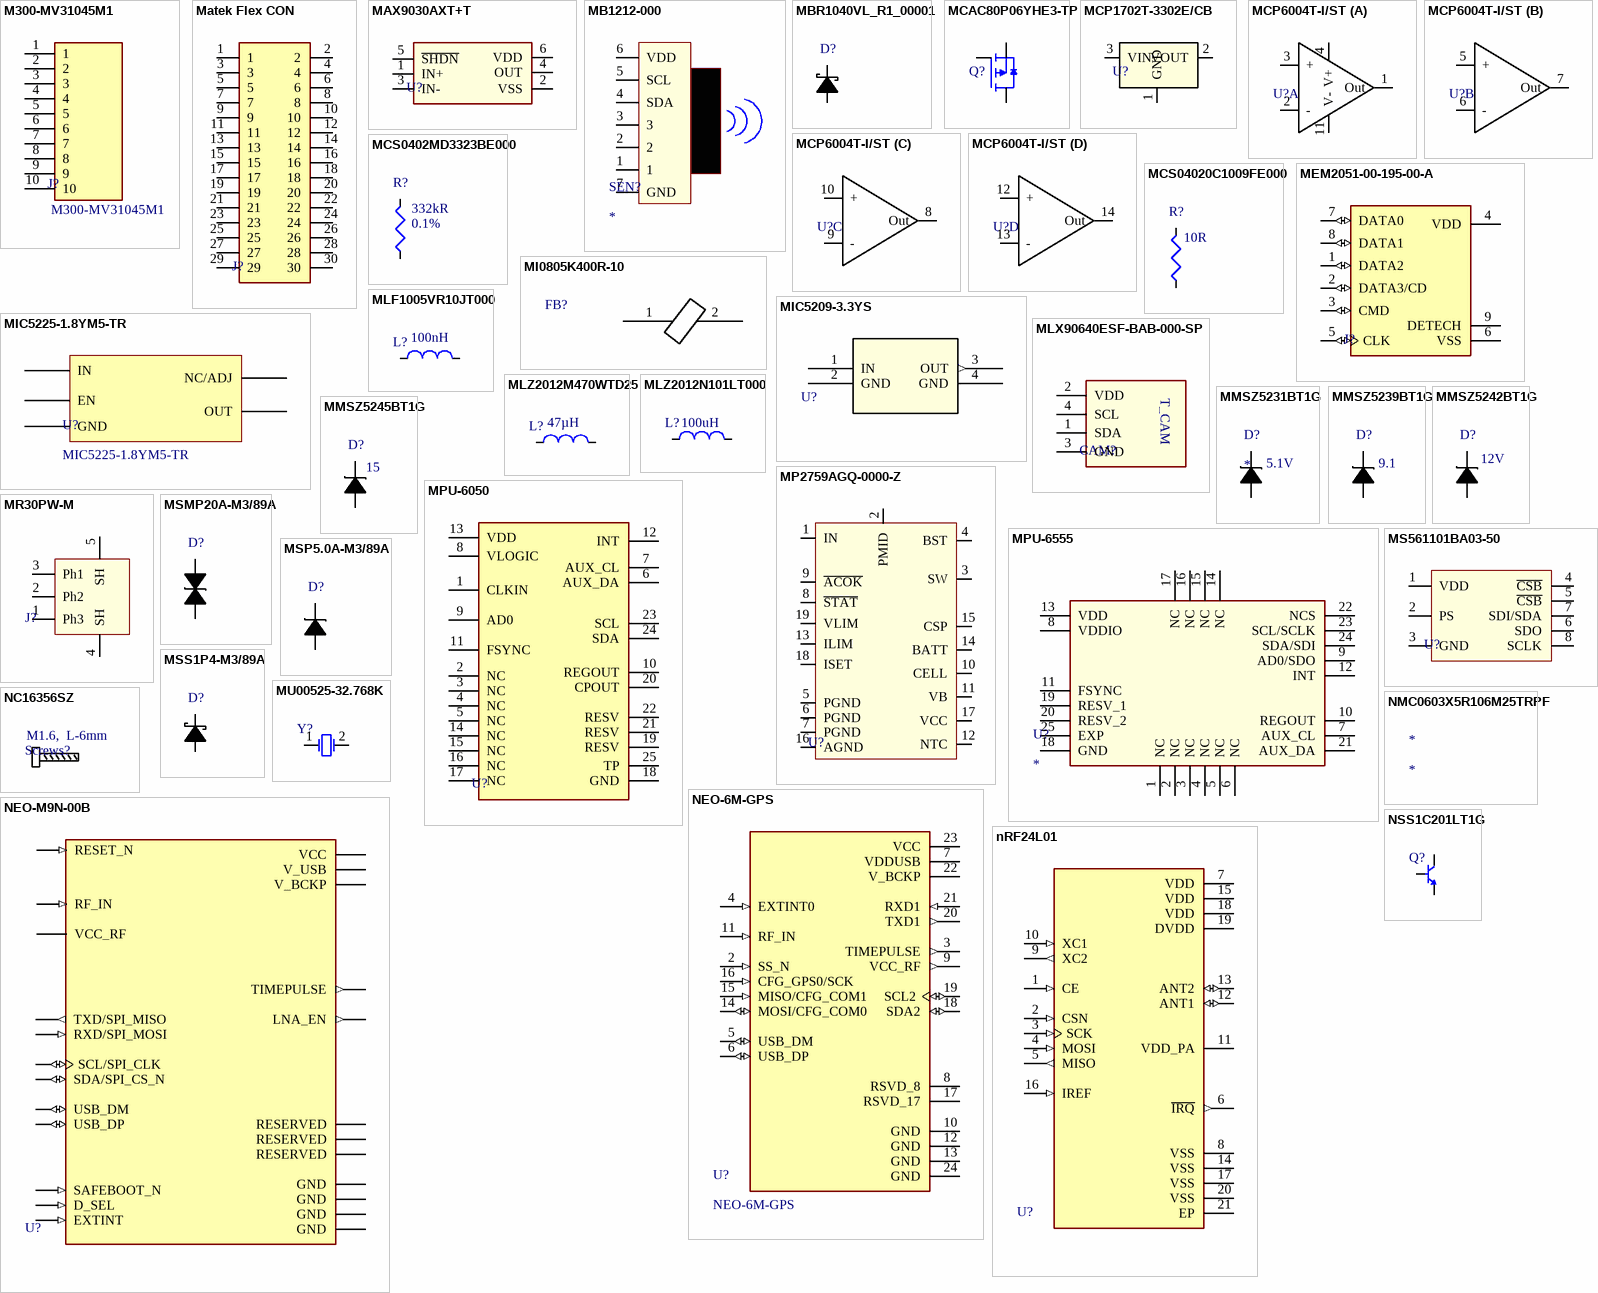
[diagram p14: symbols M300-MV31045M1 to NSS1C201LT1G]

## M300-MV31045M1
designator J?  value M300-MV31045M1
Wtb Connector, Header, 10Pos, 2Rows, 3Mm; Rohs Compliant: Yes; Manufacturer: Harwin; Number of Positions: 10; Voltage Rating (AC): 600V; Mated Stacking Heights: 8.9mm; Part Number: M300-MV31045M1; Supplier: Digikey; Supplier Part Number: 952-3085-ND; Manufacturer Part Number: M300-MV31045M1; RoHS: Yes; Category: Headers and Wire Housings; Stock: 662; Pricing: 1=9.24, 18=7.53278, 108=6.63778, 504=5.95448, 1008=5.67063 (USD); Mounting Technology: Through Hole; Pins: 10; Contact Material: Brass; Contact Shape: Circular; Contact Finish - Mating: GOLD; Insulation Material: Nylon; Insulation Color: Green; Min Operating Temperature: -65°C; Max Operating Temperature: 175°C; Packaging: Rail/Tube; Number of Rows: 2; Termination: Solder; Fastening Type: Threaded; Connector Type: Header; Series: M300; Contact Type: Male Pin, Power; RoHS Compliant: Yes; Flammability Rating: UL94 V-0; ComponentLink1URL: https://cdn.harwin.com/pdfs/Harwin_Product_Catalog_page_60.pdf?src-supplier=Digikey; ComponentLink1Description: https://cdn.harwin.com/pdfs/Harwin_Product_Catalog_page_60.pdf?src-supplier=Digikey
footprint HARWIN_M300-MV31045M1 (HARWIN 10 Pin MALE VRTCL Connector)
pins: 1, 2, 3, 4, 5, 6, 7, 8, 9, 10

## Matek Flex CON
designator J?  (value not drawn)
Connector FFC/FPC Easy-On 30 Position 0.5mm Pitch Right Angle Surface Mount; Category: FFC / FPC
footprint Matek Flex CON
pins: 1, 2, 3, 4, 5, 6, 7, 8, 9, 10, 11, 12, 13, 14, 15, 16, 17, 18, 19, 20, 21, 22, 23, 24, 25, 26, 27, 28, 29, 30

## MAX9030AXT+T
designator U?  (value not drawn)
188ns, Micropower Comparator Family Features Single Supply with Shutdown Mode in SC70-6 Package; Manufacturer: Maxim; Manufacturer Part Number: MAX9030AXT+T; Min Supply Voltage: 2.5V; Max Supply Voltage: 5.5V; Min Dual Supply Voltage: 1.25V; Max Dual Supply Voltage: 2.75V; Max Power Dissipation: 245mW; Number of Elements: 1; Propagation Delay: 228ns; Common Mode Rejection Ratio: 100dB; Input Offset Voltage (Vos): 1mV; Input Bias Current: 8nA; Quiescent Current: 55uA; Hysteresis: 4mV; Max Supply Current: 35uA; Output Type: TTL,PUSH-PULL; Supplier: Digikey; Supplier Part Number: MAX9030AXT+TCT-ND; RoHS: Yes; Category: Comparators; Stock: 7200; Pricing: 1=1.1, 10=0.983, 25=0.9332, 100=0.7666, 250=0.7166, 500=0.63328, 1000=0.49995 (USD); Mounting Technology: Surface Mount; Case/Package: SC; Pins: 6; Min Operating Temperature: -40°C; Max Operating Temperature: 125°C; Packaging: Tape and Reel; Package Quantity: 1; Max Input Current: 8nA; Number of Channels: 1; Response Time: 188ns; Power Supply Rejection Ratio (PSRR): 100dB; Type: General Purpose; Supply Current: 35uA; Series: -; Length: 2.15mm; Width: 1.35mm; Height: 1mm; Radiation Hardening: No; Lead Free: Lead Free; RoHS Compliant: Yes; Reach SVHC Compliant: Unknown; ComponentLink1URL: https://datasheet.ciiva.com/1828/max9030-max9034-1828096.pdf?src-supplier=Digikey; ComponentLink1Description: https://datasheet.ciiva.com/1828/max9030-max9034-1828096.pdf?src-supplier=Digikey; ComponentLink2URL: https://datasheet.ciiva.com/1828/max9030-max9034-1828097.pdf?src-supplier=Digikey; ComponentLink2Description: https://datasheet.ciiva.com/1828/max9030-max9034-1828097.pdf?src-supplier=Digikey; ComponentLink3URL: https://datasheet.ciiva.com/1828/max9030-max9034-1828098.pdf?src-supplier=Digikey; ComponentLink3Description: https://datasheet.ciiva.com/1828/max9030-max9034-1828098.pdf?src-supplier=Digikey; ComponentLink4URL: https://datasheet.ciiva.com/4463/max9030-max9034-4463388.pdf?src-supplier=Mouser; ComponentLink4Description: https://datasheet.ciiva.com/4463/max9030-max9034-4463388.pdf?src-supplier=Mouser; ComponentLink5URL: https://datasheet.ciiva.com/2970/max9030-max9034-2970984.pdf?src-supplier=Avnet; ComponentLink5Description: https://datasheet.ciiva.com/2970/max9030-max9034-2970984.pdf?src-supplier=Avnet
footprint MAX9030AXT+T
pins: 1 IN+, 2 VSS, 3 IN-, 4 OUT, 5 ~{SHDN}, 6 VDD

## MB1212-000
designator SEN?
Proximity Sensor Ultrasonic 20cm 3V to 5.5VDC 7-Pin Bag; Manufacturer: MaxBotix; Manufacturer Part Number: MB1212-000; Frequency: 42kHz; Voltage Rating: 5.5V; Supplier: Digi-Key; Supplier Part Number: 1863-1028-ND; RoHS: No; Category: Sensors; Stock: 2; Pricing: 1=51.69000, 5=34.95000 (USD); Min Operating Temperature: -40°C; Max Operating Temperature: 65°C; Packaging: Bulk; ComponentLink1URL: https://www.maxbotix.com/documents/I2CXL-MaxSonar-EZ_Datasheet.pdf?src-supplier=Digi-Key; ComponentLink1Description: https://www.maxbotix.com/documents/I2CXL-MaxSonar-EZ_Datasheet.pdf?src-supplier=Digi-Key
footprint MB1212
pins: 1, 2, 3, 4 SDA, 5 SCL, 6 VDD, 7 GND

## MBR1040VL_R1_00001
designator D?  (value not drawn)
Diode 40 V 1A Surface Mount SOD-123FL; Manufacturer: Pan Jit; Manufacturer Part Number: MBR1040VL_R1_00001; Supplier: Digikey; Supplier Part Number: 3757-MBR1040VL_R1_00001CT-ND; RoHS: No; Category: Uncategorized; Stock: 7961; Pricing: 1=0.41, 10=0.287, 100=0.1451, 500=0.11836, 1000=0.08781 (USD)
footprint SOD-123F
pins: 1 C, 2 A

## MCAC80P06YHE3-TP
designator Q?  (value not drawn)
Trans MOSFET P-CH 60V 80A Automotive 8-Pin DFN EP T/R; Manufacturer: MCC; Manufacturer Part Number: MCAC80P06YHE3-TP; Supplier: Digikey; Supplier Part Number: 353-MCAC80P06YHE3-TPCT-ND; RoHS: No; Category: LDO; Stock: 5320; Pricing: 1=2.75, 10=1.776, 100=1.2212, 500=0.98392, 1000=0.90764, 2000=0.84353 (USD)
footprint MCAC80P06YHE3-TP
pins: 1 S, 2 S, 3 S, 4 G, 5_8 D
